# Altium footprint library General.PCBLIB: 226 footprints (part 15 of 15)
Each footprint in its own frame and in the unit in brackets; x right, y up, seen from the top. Pads: shape width x height; smd on the part's side, far side on the other; paste and mask are expansions set on the pad; w line width, h text height; cw(c..) or ccw(c..) is an arc to the next point about the centre after c.
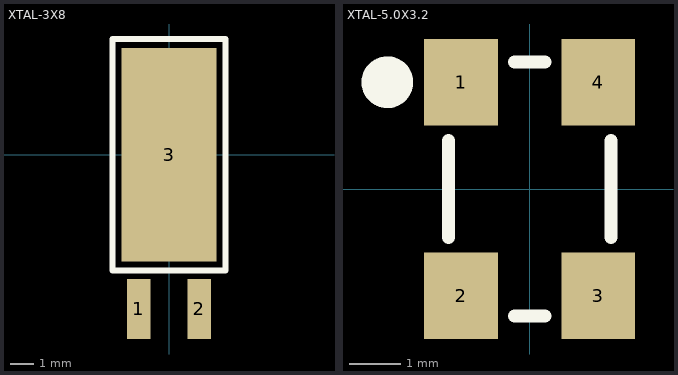
[diagram p14: the footprints below, top view; thin cyan lines are the x and y axes]

## XTAL-3X8 [mm] "Crystal"
height 3
pads (3):
  rect 1x2.54 smd: 1(-1.27,-6.5) 2(1.27,-6.5)
  rect 4x9 smd: 3(0,0)
Top Overlay:
  lines w0.254: -2.38,-4.88 2.38,-4.88 2.38,4.88 -2.38,4.88 -2.38,-4.88
3D body: height 2.24, standoff -0.01, extent -1.395,-7.5 1.395,2

## XTAL-5.0X3.2 [mm] "Oscillator"
height 1.5
pads (4):
  rect 1.45x1.7 smd: 1(-1.35,2.1) 2(-1.35,-2.1) 3(1.35,-2.1) 4(1.35,2.1)
Top Overlay:
  circle w0.508: c-2.8,2.1 r0.254
  lines w0.254: -1.6,-0.95 -1.6,0.95 ; -0.3,-2.5 0.3,-2.5 ; -0.3,2.5 0.3,2.5 ; 1.6,-0.95 1.6,0.95
3D body: height 1, standoff 0, extent -1.6,-2.5 1.6,2.5